# Altium footprint library Integrated Circuits.PcbLib: 142 footprints (part 2 of 9)
Each footprint in its own frame and in the unit in brackets; x right, y up, seen from the top. Pads: shape width x height; smd on the part's side, far side on the other; paste and mask are expansions set on the pad; w line width, h text height; cw(c..) or ccw(c..) is an arc to the next point about the centre after c.
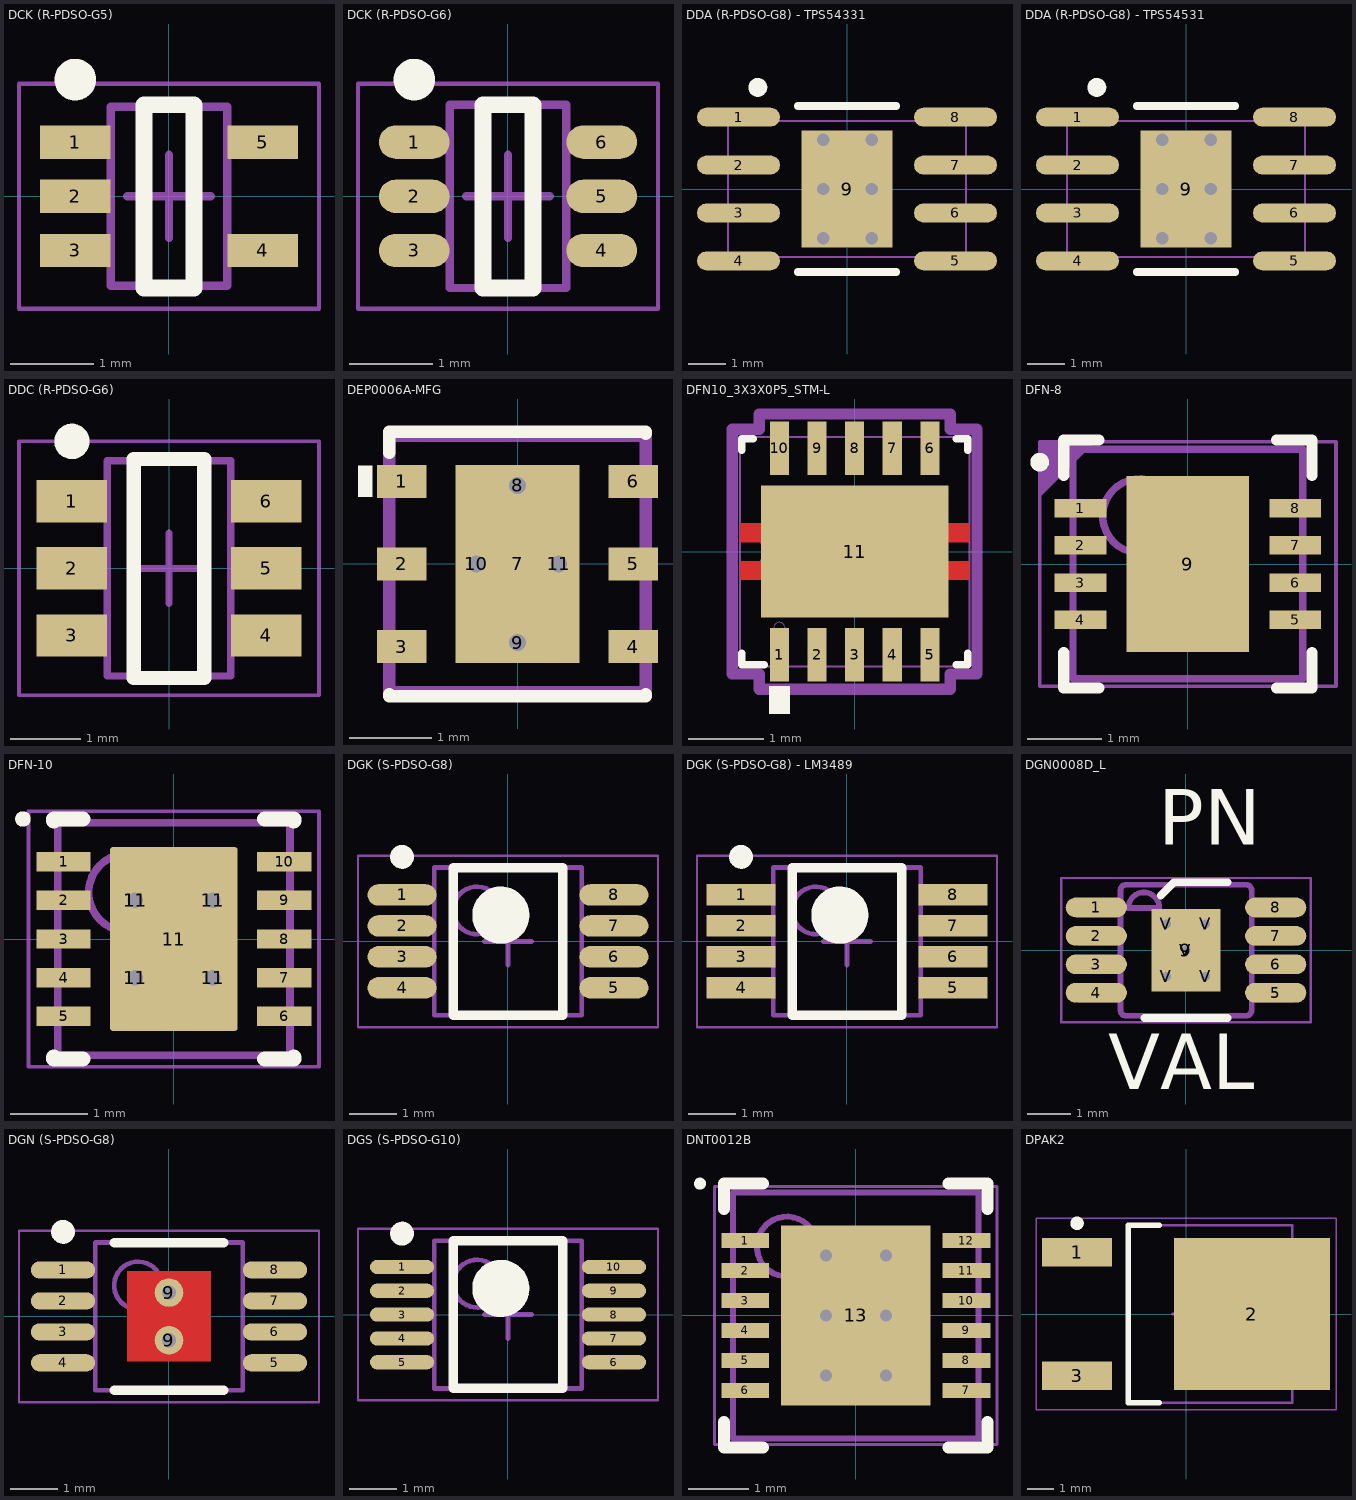
[diagram p1: the footprints below, top view; thin cyan lines are the x and y axes]

## DCK (R-PDSO-G5) [mm] "SOT23, 5-Leads, Body 2.00x2.10mm, Pitch 0.65mm, IPC Medium Density"
height 1.1
pads (5):
  rect 0.85x0.4 smd: 1(-1.125,0.65) 2(-1.125,0) 3(-1.125,-0.65) 4(1.125,-0.65) 5(1.125,0.65)
Top Overlay:
  circle w0.25: c-1.125,1.4 r0.125
  lines w0.2: -0.3,-1.1 -0.3,1.1 0.3,1.1 0.3,-1.1 -0.3,-1.1
3D Bodies:
  lines w0.1: -0.7,-1.075 0.7,-1.075 0.7,1.075 -0.7,1.075 -0.7,-1.075
Mechanical 15:
  lines w0.05: -1.8,-1.35 1.8,-1.35 1.8,1.35 -1.8,1.35 -1.8,-1.35
  lines w0.1: -0.5,0 0.5,0 ; 0,-0.5 0,0.5
3D body "DCK (R-PDSO-G5).step": height 1.1, standoff 0, extent -1.2,-1.075 1.2,1.075

## DCK (R-PDSO-G6) [mm] "TSOP, 6-Leads, Body 2.00x1.25mm, Pitch 0.65mm, IPC Medium Density"
height 1.1
pads (6):
  oval 0.85x0.4 smd: 1(-1.125,0.65) 2(-1.125,0) 3(-1.125,-0.65) 4(1.125,-0.65) 5(1.125,0) 6(1.125,0.65)
Top Overlay:
  circle w0.25: c-1.125,1.4 r0.125
  lines w0.2: -0.3,-1.1 0.3,-1.1 0.3,1.1 -0.3,1.1 -0.3,-1.1
3D Bodies:
  lines w0.1: -0.7,-1.1 0.7,-1.1 0.7,1.1 -0.7,1.1 -0.7,-1.1
Mechanical 15:
  lines w0.05: -1.8,-1.35 1.8,-1.35 1.8,1.35 -1.8,1.35 -1.8,-1.35
  lines w0.1: -0.5,0 0.5,0 ; 0,-0.5 0,0.5
3D body "User Library-R-PDSO-G6.step": height 1.1, standoff 0, extent -1.2,-1 1.2,1

## DDA (R-PDSO-G8) - TPS54331 [mm] "TPS54331 SOIC-8, PowerPAD"
height 1.1
pads (9):
  oval 2.2x0.5 smd mask+0.06: 1(-2.875,1.905) 2(-2.875,0.635) 3(-2.875,-0.635) 4(-2.875,-1.905) 5(2.875,-1.905) 6(2.875,-0.635) 7(2.875,0.635) 8(2.875,1.905)
  rect 2.4x3.1 smd mask+0.06: 9(0,0)
via -0.635,1.3 diameter 0.4 hole 0.33
via -0.635,0 diameter 0.4 hole 0.33
via -0.635,-1.3 diameter 0.4 hole 0.33
via 0.65,0 diameter 0.4 hole 0.33
via 0.65,1.3 diameter 0.4 hole 0.33
via 0.65,-1.3 diameter 0.4 hole 0.33
Top Overlay:
  circle w0.25: c-2.362,2.692 r0.125
  lines w0.2: -1.3,-2.2 1.3,-2.2 ; -1.3,2.2 1.3,2.2
3D Bodies:
  circle w0.1: c-0.65,0.65 r0.5
Mechanical 15:
  lines w0.05: -3.15,-1.8 3.15,-1.8 3.15,1.8 -3.15,1.8 -3.15,-1.8
  lines w0.1: -0.5,0 0.5,0 ; 0,-0.5 0,0.5
3D body "SO-8 TPS54331 v8.step": height 1.35, standoff 0, extent -2.99,-2.45 2.99,2.45

## DDA (R-PDSO-G8) - TPS54531 [mm] "TPS54531 SOIC-8, PowerPAD"
height 1.1
pads (9):
  oval 2.2x0.5 smd mask+0.06: 1(-2.875,1.905) 2(-2.875,0.635) 3(-2.875,-0.635) 4(-2.875,-1.905) 5(2.875,-1.905) 6(2.875,-0.635) 7(2.875,0.635) 8(2.875,1.905)
  rect 2.4x3.1 smd mask+0.06: 9(0,0)
via 0.65,-1.3 diameter 0.4 hole 0.33
via 0.65,1.3 diameter 0.4 hole 0.33
via 0.65,0 diameter 0.4 hole 0.33
via -0.635,-1.3 diameter 0.4 hole 0.33
via -0.635,0 diameter 0.4 hole 0.33
via -0.635,1.3 diameter 0.4 hole 0.33
Top Overlay:
  circle w0.25: c-2.362,2.692 r0.125
  lines w0.2: -1.3,-2.2 1.3,-2.2 ; -1.3,2.2 1.3,2.2
3D Bodies:
  circle w0.1: c-0.65,0.65 r0.5
Mechanical 15:
  lines w0.05: -3.15,-1.8 -3.15,1.8 3.15,1.8 3.15,-1.8 -3.15,-1.8
  lines w0.1: -0.5,0 0.5,0 ; 0,-0.5 0,0.5
3D body "SO-8 TPS54531 v4.step": height 1.35, standoff 0, extent -2.99,-2.45 2.99,2.45

## DDC (R-PDSO-G6) [mm] "SOT23, 6-Leads, Body 2.90x2.80mm, Pitch 0.95mm, IPC Medium Density"
height 1.1
pads (6):
  rect 1x0.6 smd: 1(-1.375,0.95) 2(-1.375,0) 3(-1.375,-0.95) 4(1.375,-0.95) 5(1.375,0) 6(1.375,0.95)
Top Overlay:
  circle w0.25: c-1.375,1.8 r0.125
  lines w0.2: -0.5,-1.55 -0.5,1.55 0.5,1.55 0.5,-1.55 -0.5,-1.55
3D Bodies:
  lines w0.1: -0.875,-1.525 0.875,-1.525 0.875,1.525 -0.875,1.525 -0.875,-1.525
Mechanical 15:
  lines w0.05: -2.125,-1.8 2.125,-1.8 2.125,1.8 -2.125,1.8 -2.125,-1.8
  lines w0.1: -0.5,0 0.5,0 ; 0,-0.5 0,0.5
3D body "DDC (R-PDSO-G6).step": height 1.1, standoff 0, extent -1.525,-1.525 1.525,1.525

## DEP0006A-MFG [mm]
pads (11):
  rect 0.6x0.4 smd paste+0 mask+0: 1(-1.4,1) 2(-1.4,0) 3(-1.4,-1) 4(1.4,-1) 5(1.4,0) 6(1.4,1)
  rect 1.5x2.4 smd paste-1.187 mask+0: 7(0,0)
  round 0.5 / inner round 1.524 / far side round 0.5 hole 0.203 paste-2539.97 mask-0.241: 8(0,0.95) 9(0,-0.95) 10(-0.5,0) 11(0.5,0)
Top Overlay:
  rectangle: -1.93,0.813 -1.753,1.194
  lines w0.15: -1.55,-1.575 -1.55,-1.6 1.55,-1.6 1.55,-1.575 ; -1.55,1.346 -1.55,1.6 1.55,1.6 1.55,1.575
Top Paste:
  region: -0.69,1.11 -0.64,1.16 0.64,1.16 0.69,1.11 0.69,0.15 0.64,0.1 -0.64,0.1 -0.69,0.15
  region: 0.64,-0.1 0.69,-0.15 0.69,-1.11 0.64,-1.16 -0.64,-1.16 -0.69,-1.11 -0.69,-0.15 -0.64,-0.1
3D Bodies:
  lines w0.15: -1.55,-1.55 1.55,-1.55 1.55,1.55 -1.55,1.55 -1.55,-1.55
3D body "DEP0006A.stp": height 1.06, standoff 0, extent -1.5,-1.5 1.5,1.5

## DFN10_3X3X0P5_STM-L [mil]
pads (11):
  rect 10x28 smd paste+0 mask+0: 1(-39.37,-54) 2(-19.68,-54) 3(0,-54) 4(19.68,-54) 5(39.37,-54) 6(39.37,54) 7(19.68,54) 8(0,54) 9(-19.68,54) 10(-39.37,54)
  rect 98x69 smd paste+0 mask+0: 11(0,0)
Top Layer:
  region: 49,4.92 49,14.76 59.83,14.76 59.83,4.92
  region: 49,-4.92 49,-14.76 59.83,-14.76 59.83,-4.92
  region: -49,4.92 -49,14.76 -59.83,14.76 -59.83,4.92
  region: -49,-4.92 -49,-14.76 -59.83,-14.76 -59.83,-4.92
Top Overlay:
  region: -44.78,-70.39 -33.91,-70.39 -33.91,-84.92 -44.78,-84.92
  lines w3.94: -59.06,-53.15 -59.06,-59.06 -47.24,-59.06 ; -59.05,53.15 -59.05,59.06 -53.14,59.06 ; 53.15,-59.06 59.06,-59.06 59.06,-53.15 ; 53.16,59.05 59.06,59.05 59.06,53.15
Top Paste:
  region: 49,4.92 49,14.76 59.83,14.76 59.83,4.92
  region: 49,-4.92 49,-14.76 59.83,-14.76 59.83,-4.92
  region: -49,4.92 -49,14.76 -59.83,14.76 -59.83,4.92
  region: -49,-4.92 -49,-14.76 -59.83,-14.76 -59.83,-4.92
Top Solder:
  region: 49,4.92 49,14.76 59.83,14.76 59.83,4.92
  region: 49,-4.92 49,-14.76 59.83,-14.76 59.83,-4.92
  region: -49,4.92 -49,14.76 -59.83,14.76 -59.83,4.92
  region: -49,-4.92 -49,-14.76 -59.83,-14.76 -59.83,-4.92
Top Courtyard:
  lines w6: -64,-64 -64,64 -50.01,64 -50.01,72 50.01,72 50.01,64 64,64 64,-64 50.01,-64 50.01,-72 -50.01,-72 -50.01,-64 -64,-64
3D Bodies:
  circle w0: c-39.37,-40 r3
  lines w0: -60,-12 ccw(c-60,0) -60,12
  lines w1: -60,-60 60,-60 60,60 -60,60 -60,-60
3D body "DFN10_3X3X0P5_STM v2.step": height 34.48, standoff 0, extent -59.1,-59.1 59.1,59.1

## DFN-8 [mm] "QFN, 8-Leads, Body 3.00x3.00mm, Pitch 0.50mm, Thermal Pad 1.65x2.38mm, IPC Medium Density"
height 0.8
pads (9):
  rect 0.7x0.25 smd: 1(-1.45,0.75) 2(-1.45,0.25) 3(-1.45,-0.25) 4(-1.45,-0.75) 5(1.45,-0.75) 6(1.45,-0.25) 7(1.45,0.25) 8(1.45,0.75)
  rect 1.65x2.38 smd: 9(0,0)
Top Overlay:
  circle w0.152: c-2,1.375 r0.05
  lines w0.152: -1.675,-1.2 -1.675,-1.675 -1.2,-1.675 ; -1.675,1.2 -1.675,1.675 -1.2,1.675 ; 1.2,-1.675 1.675,-1.675 1.675,-1.2 ; 1.2,1.675 1.675,1.675 1.675,1.2
3D Bodies:
  circle w0.1: c-0.65,0.65 r0.5
  lines w0.1: -1.55,-1.55 -1.55,1.55 1.55,1.55 1.55,-1.55 -1.55,-1.55
Mechanical 15:
  region: -2,0.9 -1.25,1.65 -2,1.65
  lines w0.05: -2,-1.65 -2,1.65 2,1.65 2,-1.65 -2,-1.65
  lines w0.1: -0.5,0 0.5,0 ; 0,-0.5 0,0.5
3D body "QFN50P300X300X80_HS-9N.step": height 0.8, standoff 0, extent -1.6,-1.55 1.6,1.55

## DFN-10 [mm] "10-LEAD (3mm × 3mm) PLASTIC DFN (10-WFDFN)"
height 0.75
pads (16):
  rect 0.7x0.25 smd mask+0.102: 1(-1.425,1) 2(-1.425,0.5) 3(-1.425,0) 4(-1.425,-0.5) 5(-1.425,-1) 6(1.425,-1) 7(1.425,-0.5) 8(1.425,0) 9(1.425,0.5) 10(1.425,1)
  round 0.5 hole 0.2: 11(-0.5,-0.5) 11(-0.5,0.5) 11(-0.5,0.5) 11(0.5,-0.5) 11(0.5,0.5)
  rrect5% 1.65x2.38 smd mask+0.102: 11(0,0)
Top Overlay:
  circle w0.1: c-1.95,1.55 r0.05
  lines w0.2: -1.55,-1.525 -1.55,-1.55 -1.175,-1.55 ; -1.55,1.525 -1.55,1.55 -1.175,1.55 ; 1.175,-1.55 1.55,-1.55 1.55,-1.525 ; 1.175,1.55 1.55,1.55 1.55,1.525
Top 3D Body:
  circle w0.1: c-0.6,0.6 r0.5
  lines w0.1: -1.5,-1.5 1.5,-1.5 1.5,1.5 -1.5,1.5 -1.5,-1.5
Top Courtyard:
  lines w0.05: -1.875,-1.65 1.875,-1.65 1.875,1.65 -1.875,1.65 -1.875,-1.65
  lines w0.1: -0.5,0 0.5,0 ; 0,-0.5 0,0.5
3D body "DFN10 LT3463 v1.step": height 0.75, standoff 0, extent -1.5,-1.5 1.5,1.5

## DGK (S-PDSO-G8) [mm] "TSOP, 8-Leads, Body 3.00x3.00mm, Pitch 0.65mm, IPC Medium Density"
height 1.1
pads (8):
  oval 1.45x0.45 smd: 1(-2.225,0.975) 2(-2.225,0.325) 3(-2.225,-0.325) 4(-2.225,-0.975) 5(2.225,-0.975) 6(2.225,-0.325) 7(2.225,0.325) 8(2.225,0.975)
Top Overlay:
  circle w0.25: c-2.225,1.775 r0.125
  circle w0.6: c-0.15,0.55 r0.3
  lines w0.2: -1.15,-1.55 -1.15,1.55 1.15,1.55 1.15,-1.55 -1.15,-1.55
3D Bodies:
  circle w0.1: c-0.65,0.65 r0.5
  lines w0.1: -1.55,-1.55 -1.55,1.55 1.55,1.55 1.55,-1.55 -1.55,-1.55
Mechanical 15:
  lines w0.05: -3.15,-1.8 -3.15,1.8 3.15,1.8 3.15,-1.8 -3.15,-1.8
  lines w0.1: -0.5,0 0.5,0 ; 0,-0.5 0,0.5
3D body "DGK (S-PDSO-G8).step": height 1.1, standoff 0, extent -2.45,-1.55 2.45,1.55

## DGK (S-PDSO-G8) - LM3489 [mm] "LM3489 TSOP, 8-Leads, Body 3.00x3.00mm, Pitch 0.65mm, IPC Medium Density"
height 1.1
pads (8):
  rect 1.45x0.45 smd: 1(-2.225,0.975) 2(-2.225,0.325) 3(-2.225,-0.325) 4(-2.225,-0.975) 5(2.225,-0.975) 6(2.225,-0.325) 7(2.225,0.325) 8(2.225,0.975)
Top Overlay:
  circle w0.6: c-0.15,0.55 r0.3
  circle w0.25: c-2.225,1.775 r0.125
  lines w0.2: -1.15,-1.55 1.15,-1.55 1.15,1.55 -1.15,1.55 -1.15,-1.55
3D Bodies:
  circle w0.1: c-0.65,0.65 r0.5
  lines w0.1: -1.55,-1.55 1.55,-1.55 1.55,1.55 -1.55,1.55 -1.55,-1.55
Mechanical 15:
  lines w0.05: -3.15,-1.8 3.15,-1.8 3.15,1.8 -3.15,1.8 -3.15,-1.8
  lines w0.1: -0.5,0 0.5,0 ; 0,-0.5 0,0.5
3D body "SO-8 LM3489 v1.step": height 1.1, standoff 0, extent -2.451,-1.498 2.451,1.499

## DGN0008D_L [mm]
pads (14):
  oval 1.4x0.45 smd paste-0.102 mask+0.051: 1(-2.05,0.975) 2(-2.05,0.325) 3(-2.05,-0.325) 4(-2.05,-0.975) 5(2.05,-0.975) 6(2.05,-0.325) 7(2.05,0.325) 8(2.05,0.975)
  rect 1.57x1.89 smd paste-0.102 mask+0.051: 9(0,0)
  round 0.5 / inner round 1.524 / far side round 0.5 hole 0.203 mask+0.051: V(-0.45,-0.6) V(-0.45,0.6) V(0,0) V(0.45,-0.6) V(0.45,0.6)
Top Overlay:
  lines w0.178: -0.95,-1.55 0.95,-1.55 ; -0.575,1.25 -0.275,1.55 0.95,1.55
  text "PN" at -0.635,2.413 h1.27
  text "VAL" at -1.778,-3.175 h1.27
3D Bodies:
  lines w0.127: -2.45,-1.131 -2.21,-1.131 -2.09,-1.131 -2.087,-1.131 -1.784,-1.131 -1.498,-1.131 -1.498,-0.826 -1.784,-0.826 -2.087,-0.826 -2.09,-0.826 -2.21,-0.826 -2.45,-0.826 -2.45,-1.131 ; -2.45,-0.48 -2.21,-0.48 -2.09,-0.48 -2.087,-0.48 -1.784,-0.48 -1.498,-0.48 -1.498,-0.175 -1.784,-0.175 -2.087,-0.175 -2.09,-0.175 -2.21,-0.175 -2.45,-0.175 -2.45,-0.48 ; -2.45,0.17 -2.21,0.17 -2.09,0.17 -2.087,0.17 -1.784,0.17 -1.498,0.17 -1.498,0.475 -1.784,0.475 -2.087,0.475 -2.09,0.475 -2.21,0.475 -2.45,0.475 -2.45,0.17 ; -2.45,0.82 -2.21,0.82 -2.09,0.82 -2.087,0.82 -1.784,0.82 -1.498,0.82 -1.498,1.125 -1.784,1.125 -2.087,1.125 -2.09,1.125 -2.21,1.125 -2.45,1.125 -2.45,0.82 ; -1.497,-1.377 ccw(c-1.37,-1.374) -1.373,-1.501 -1.371,-1.501 1.373,-1.501 1.375,-1.501 ccw(c1.373,-1.374) 1.5,-1.377 1.5,-1.374 1.5,1.369 1.5,1.372 ccw(c1.373,1.369) 1.375,1.496 1.373,1.496 -1.371,1.496 -1.373,1.496 ccw(c-1.37,1.369) -1.497,1.372 -1.498,1.369 -1.498,-1.374 -1.497,-1.377 ; -1.32,0.962 cw(c-0.964,0.962) -0.609,0.962 -1.32,0.962 ; 1.5,-1.131 1.5,-0.826 1.786,-0.826 2.089,-0.826 2.093,-0.826 2.213,-0.826 2.452,-0.826 2.452,-1.131 2.213,-1.131 2.093,-1.131 2.089,-1.131 1.786,-1.131 1.5,-1.131 ; 1.5,-0.48 1.5,-0.175 1.786,-0.175 2.089,-0.175 2.093,-0.175 2.213,-0.175 2.452,-0.175 2.452,-0.48 2.213,-0.48 2.093,-0.48 2.089,-0.48 1.786,-0.48 1.5,-0.48 ; 1.5,0.17 1.5,0.475 1.786,0.475 2.089,0.475 2.093,0.475 2.213,0.475 2.452,0.475 2.452,0.17 2.213,0.17 2.093,0.17 2.089,0.17 1.786,0.17 1.5,0.17 ; 1.5,0.82 1.5,1.125 1.786,1.125 2.089,1.125 2.093,1.125 2.213,1.125 2.452,1.125 2.452,0.82 2.213,0.82 2.093,0.82 2.089,0.82 1.786,0.82 1.5,0.82
  text ".Designator" at 3.175,-0.254 h1.27
Mechanical 15:
  lines w0.05: -2.85,-1.65 2.85,-1.65 2.85,1.65 -2.85,1.65 -2.85,-1.65
  lines w0.1: -0.5,0 0.5,0 ; 0,-0.5 0,0.5
3D body: height 0.25, standoff 0, extent 0,0 0.254,0.254

## DGN (S-PDSO-G8) [mm] "SOP, 8-Leads, Body 3.00x3.00mm, Pitch 0.65mm, Thermal Pad 1.89x1.57mm, IPC Medium Density"
height 1.1
pads (10):
  oval 1.35x0.36 smd mask+0.06: 1(-2.225,0.975) 2(-2.225,0.325) 3(-2.225,-0.325) 4(-2.225,-0.975) 5(2.225,-0.975) 6(2.225,-0.325) 7(2.225,0.325) 8(2.225,0.975)
  round 0.6 hole 0.3 mask+0: 9(0,-0.5) 9(0,0.5)
Top Layer:
  region: -0.878,0.944 -0.877,0.945 0.874,0.945 0.874,-0.945 0.869,-0.94 -0.878,-0.94
Top Overlay:
  circle w0.25: c-2.225,1.775 r0.125
  lines w0.2: -1.15,-1.55 1.15,-1.55 ; -1.15,1.55 1.15,1.55
3D Bodies:
  circle w0.1: c-0.65,0.65 r0.5
  lines w0.1: -1.55,-1.55 1.55,-1.55 1.55,1.55 -1.55,1.55 -1.55,-1.55
Mechanical 15:
  lines w0.05: -3.15,-1.8 3.15,-1.8 3.15,1.8 -3.15,1.8 -3.15,-1.8
  lines w0.1: -0.5,0 0.5,0 ; 0,-0.5 0,0.5
3D body: height 1.1, standoff 0.05, extent -1.55,-1.55 1.55,1.55

## DGS (S-PDSO-G10) [mm] "TSSOP, 10-Leads, Body 3.00x3.00mm, Pitch 0.50mm, IPC Medium Density"
height 1.1
pads (10):
  oval 1.35x0.3 smd: 1(-2.225,1) 2(-2.225,0.5) 3(-2.225,0) 4(-2.225,-0.5) 5(-2.225,-1) 6(2.225,-1) 7(2.225,-0.5) 8(2.225,0) 9(2.225,0.5) 10(2.225,1)
Top Overlay:
  circle w0.6: c-0.15,0.55 r0.3
  circle w0.25: c-2.225,1.7 r0.125
  lines w0.2: -1.15,-1.55 1.15,-1.55 1.15,1.55 -1.15,1.55 -1.15,-1.55
3D Bodies:
  circle w0.1: c-0.65,0.65 r0.5
  lines w0.1: -1.55,-1.55 1.55,-1.55 1.55,1.55 -1.55,1.55 -1.55,-1.55
Mechanical 15:
  lines w0.05: -3.15,-1.8 3.15,-1.8 3.15,1.8 -3.15,1.8 -3.15,-1.8
  lines w0.1: -0.5,0 0.5,0 ; 0,-0.5 0,0.5
3D body "DGS (S-PDSO-G10).step": height 1.1, standoff 0, extent -2.45,-1.55 2.45,1.55

## DNT0012B [mm] "SON, 12-Leads, Body 4.00x4.00mm, Pitch 0.50mm, Thermal Pad 3.00x2.49mm, IPC High Density"
height 0.8
pads (13):
  rect 0.8x0.25 smd: 1(-1.845,1.25) 2(-1.845,0.75) 3(-1.845,0.25) 4(-1.845,-0.25) 5(-1.845,-0.75) 6(-1.845,-1.25) 7(1.845,-1.25) 8(1.845,-0.75) 9(1.845,-0.25) 10(1.845,0.25) 11(1.845,0.75) 12(1.845,1.25)
  rect 2.49x3 smd paste-1.245: 13(0,0)
via -0.5,1 diameter 0.5 hole 0.2
via 0.5,1 diameter 0.5 hole 0.2
via -0.5,0 diameter 0.5 hole 0.2
via 0.5,0 diameter 0.5 hole 0.2
via -0.5,-1 diameter 0.5 hole 0.2
via 0.5,-1 diameter 0.5 hole 0.2
Top Overlay:
  circle w0.1: c-2.6,2.2 r0.05
  lines w0.2: -2.2,-1.775 -2.2,-2.2 -1.545,-2.2 ; -2.2,1.775 -2.2,2.2 -1.545,2.2 ; 1.545,-2.2 2.2,-2.2 2.2,-1.775 ; 1.545,2.2 2.2,2.2 2.2,1.775
Top Paste:
  rectangle: 0.1,-1.4 1.15,-0.1
  rectangle: 0.1,0.1 1.15,1.4
  rectangle: -1.15,-1.4 -0.1,-0.1
  rectangle: -1.15,0.1 -0.1,1.4
3D Bodies:
  circle w0.1: c-1.15,1.15 r0.5
  lines w0.1: -2.05,-2.05 2.05,-2.05 2.05,2.05 -2.05,2.05 -2.05,-2.05
Mechanical 15:
  lines w0.05: -2.355,-2.15 2.355,-2.15 2.355,2.15 -2.355,2.15 -2.355,-2.15
  lines w0.1: -0.5,0 0.5,0 ; 0,-0.5 0,0.5
3D body "DNT0012B.step": height 0.8, standoff 0, extent -2.15,-2.05 2.15,2.05

## DPAK2 [mm] "D-PAK, 3-Pads, Body 6.15x6.65mm (max), IPC Medium Density"
height 2.29
pads (3):
  rect 2.6x1.06 smd: 1(-4.05,2.29) 3(-4.05,-2.29)
  rect 5.8x5.632 smd: 2(2.45,0)
Top Overlay:
  circle w0.25: c-4.05,3.37 r0.125
  lines w0.2: -1,-3.3 -2.15,-3.3 -2.15,3.3 -1,3.3
3D Bodies:
  lines w0.1: -2.15,-3.3 3.95,-3.3 3.95,3.3 -2.15,3.3 -2.15,-3.3
Mechanical 15:
  lines w0.05: -5.575,-3.55 5.575,-3.55 5.575,3.55 -5.575,3.55 -5.575,-3.55
  lines w0.1: -0.5,0 0.5,0 ; 0,-0.5 0,0.5
3D body "TO-252AA-IRF.stp": height 2.39, standoff 0, extent -5.207,-3.356 5.207,3.356